# Altium footprint library MyPcbLib.PcbLib: 657 footprints (part 3 of 42)
Each footprint in its own frame and in the unit in brackets; x right, y up, seen from the top. Pads: shape width x height; smd on the part's side, far side on the other; paste and mask are expansions set on the pad; w line width, h text height; cw(c..) or ccw(c..) is an arc to the next point about the centre after c.
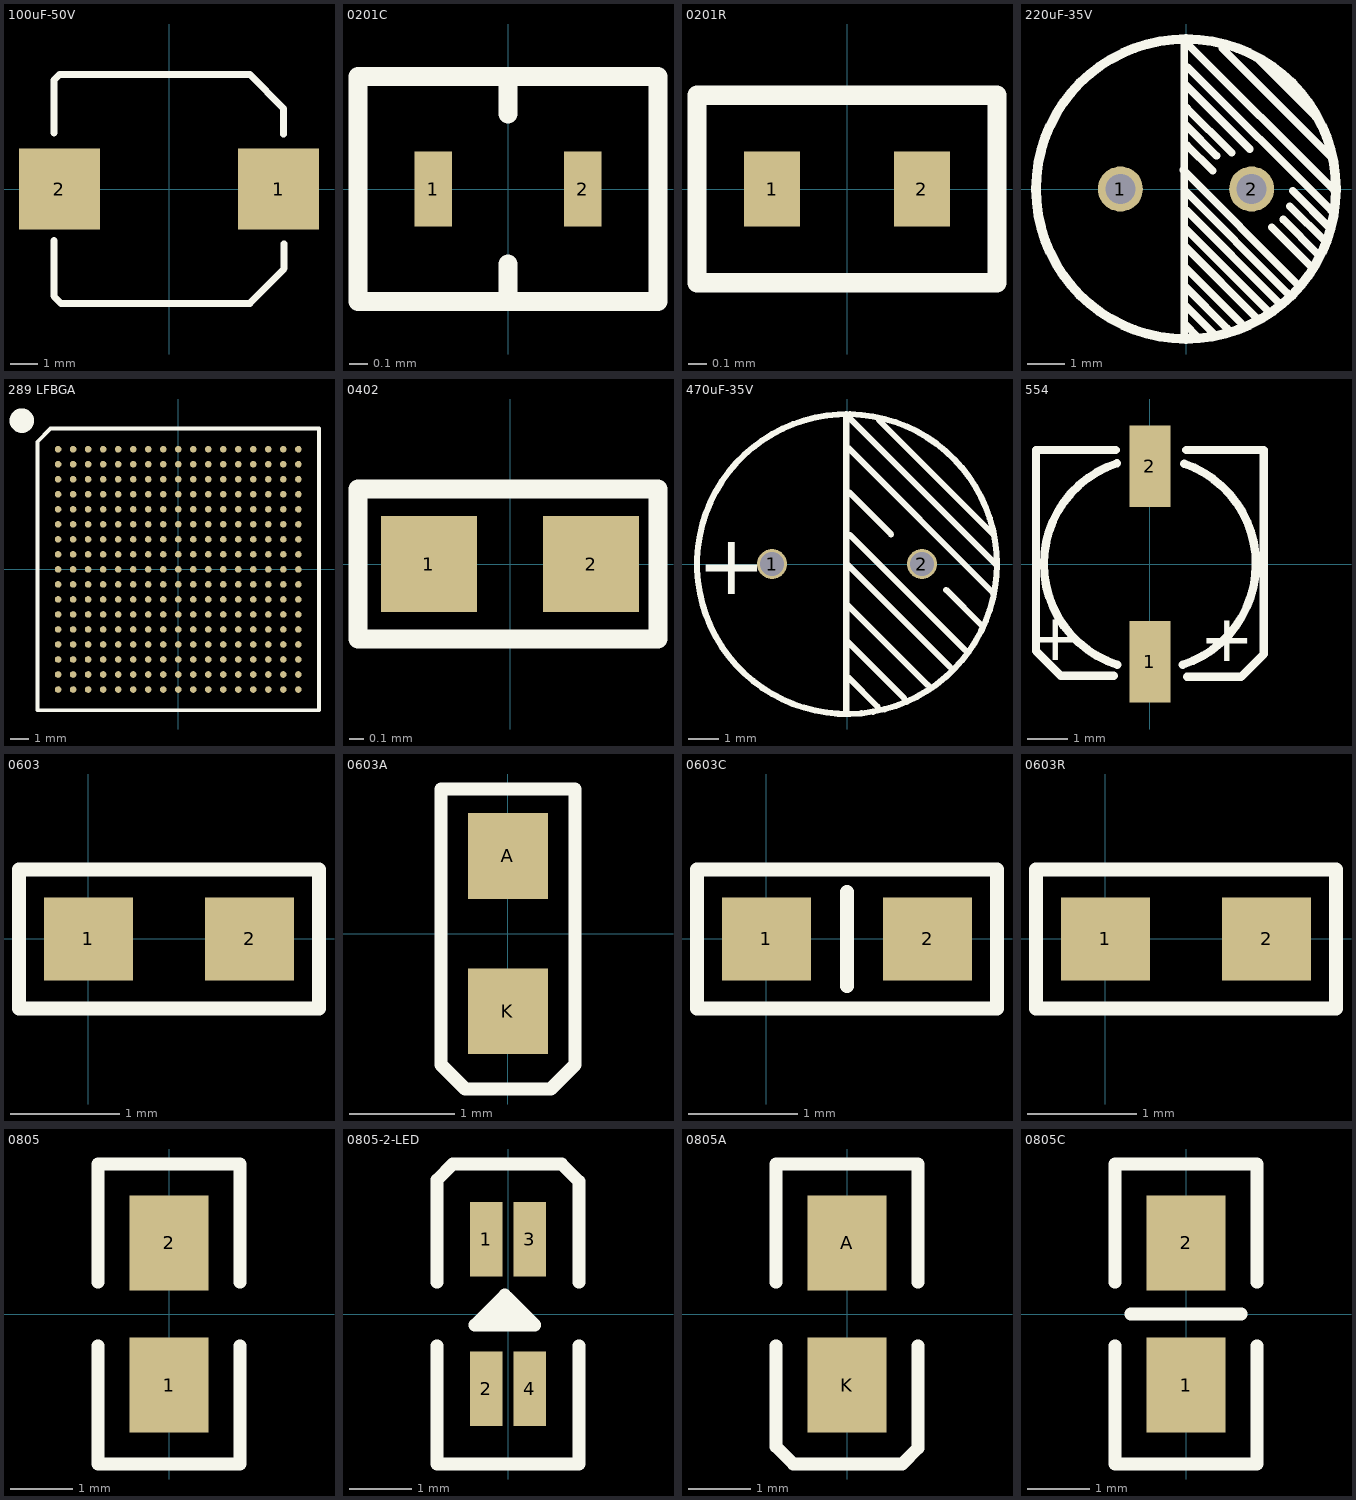
[diagram p2: the footprints below, top view; thin cyan lines are the x and y axes]

## 100uF-50V [mm]
pads (2):
  rect 3x3 smd: 1(4.064,0) 2(-4.064,0)
Top Overlay:
  lines w0.254: -4.267,-3.962 -4.267,-1.905 ; -4.267,2.083 -4.267,4.039 ; -4.25,-4.005 -4.005,-4.25 3,-4.25 ; -4.25,4.056 -4.056,4.25 3,4.25 ; 2.997,4.242 4.25,2.989 ; 3.01,-4.229 4.25,-2.989 ; 4.242,2.032 4.242,2.946 ; 4.267,-2.946 4.267,-2.032

## 0201C [mm]
pads (2):
  rect 0.2x0.4 smd: 1(-0.4,0) 2(0.4,0)
Top Overlay:
  lines w0.102: 0,-0.6 0,-0.4 ; 0,0.4 0,0.6 ; -0.8,-0.6 -0.8,0.6 0.8,0.6 0.8,-0.6 -0.8,-0.6

## 0201R [mm]
pads (2):
  rect 0.3x0.4 smd: 1(-0.4,0) 2(0.4,0)
Top Overlay:
  lines w0.102: -0.8,-0.5 -0.8,0.5 0.8,0.5 0.8,-0.5 -0.8,-0.5

## 220uF-35V [mm]
pads (2):
  round 1.2 hole 0.8: 1(-1.75,0) 2(1.75,0)
Top Overlay:
  circle w0.254: c0,0 r4
  lines w0.203: -0.076,0.508 2.972,-2.54 ; -0.051,-3.988 -0.051,3.962 ; -0.051,-3.581 0.33,-3.962 ; -0.051,-3.073 0.711,-3.835 ; -0.051,-2.057 1.473,-3.581 ; -0.051,-0.025 2.692,-2.769 ; -0.025,-1.041 2.21,-3.277 ; 0,-2.616 1.092,-3.708 ; 0,-1.549 1.905,-3.454 ; 0,-0.559 2.464,-3.023 ; 0,1.702 0.813,0.889 ; 0,2.769 1.702,1.067 ; 0.025,1.168 0.711,0.483 ; 0.025,2.159 1.219,0.965 ; 0.025,3.886 3.937,-0.025 ; 0.051,3.251 3.861,-0.559 ; 0.965,3.759 3.886,0.838 ; 1.956,3.429 3.454,1.93 ; 2.286,-1.016 3.378,-2.108 ; 2.591,-0.813 3.531,-1.753 ; 2.769,-0.457 3.734,-1.422 ; 2.845,-0.051 3.861,-1.067

## 289 LFBGA [mm]
pads (289):
  round 0.35 smd: A1(-6.4,6.4) A2(-5.6,6.4) A3(-4.8,6.4) A4(-4,6.4) A5(-3.2,6.4) A6(-2.4,6.4) A7(-1.6,6.4) A8(-0.8,6.4) A9(0,6.4) A10(0.8,6.4) A11(1.6,6.4) A12(2.4,6.4) A13(3.2,6.4) A14(4,6.4) A15(4.8,6.4) A16(5.6,6.4) A17(6.4,6.4) B1(-6.4,5.6) B2(-5.6,5.6) B3(-4.8,5.6) B4(-4,5.6) B5(-3.2,5.6) B6(-2.4,5.6) B7(-1.6,5.6) B8(-0.8,5.6) B9(0,5.6) B10(0.8,5.6) B11(1.6,5.6) B12(2.4,5.6) B13(3.2,5.6) B14(4,5.6) B15(4.8,5.6) B16(5.6,5.6) B17(6.4,5.6) C1(-6.4,4.8) C2(-5.6,4.8) C3(-4.8,4.8) C4(-4,4.8) C5(-3.2,4.8) C6(-2.4,4.8) C7(-1.6,4.8) C8(-0.8,4.8) C9(0,4.8) C10(0.8,4.8) C11(1.6,4.8) C12(2.4,4.8) C13(3.2,4.8) C14(4,4.8) C15(4.8,4.8) C16(5.6,4.8) C17(6.4,4.8) D1(-6.4,4) D2(-5.6,4) D3(-4.8,4) D4(-4,4) D5(-3.2,4) D6(-2.4,4) D7(-1.6,4) D8(-0.8,4) D9(0,4) D10(0.8,4) D11(1.6,4) D12(2.4,4) D13(3.2,4) D14(4,4) D15(4.8,4) D16(5.6,4) D17(6.4,4) E1(-6.4,3.2) E2(-5.6,3.2) E3(-4.8,3.2) E4(-4,3.2) E5(-3.2,3.2) E6(-2.4,3.2) E7(-1.6,3.2) E8(-0.8,3.2) E9(0,3.2) E10(0.8,3.2) E11(1.6,3.2) E12(2.4,3.2) E13(3.2,3.2) E14(4,3.2) E15(4.8,3.2) E16(5.6,3.2) E17(6.4,3.2) F1(-6.4,2.4) F2(-5.6,2.4) F3(-4.8,2.4) F4(-4,2.4) F5(-3.2,2.4) F6(-2.4,2.4) F7(-1.6,2.4) F8(-0.8,2.4) F9(0,2.4) F10(0.8,2.4) F11(1.6,2.4) F12(2.4,2.4) F13(3.2,2.4) F14(4,2.4) F15(4.8,2.4) F16(5.6,2.4) F17(6.4,2.4) G1(-6.4,1.6) G2(-5.6,1.6) G3(-4.8,1.6) G4(-4,1.6) G5(-3.2,1.6) G6(-2.4,1.6) G7(-1.6,1.6) G8(-0.8,1.6) G9(0,1.6) G10(0.8,1.6) G11(1.6,1.6) G12(2.4,1.6) G13(3.2,1.6) G14(4,1.6) G15(4.8,1.6) G16(5.6,1.6) G17(6.4,1.6) H1(-6.4,0.8) H2(-5.6,0.8) H3(-4.8,0.8) H4(-4,0.8) H5(-3.2,0.8) H6(-2.4,0.8) H7(-1.6,0.8) H8(-0.8,0.8) H9(0,0.8) H10(0.8,0.8) H11(1.6,0.8) H12(2.4,0.8) H13(3.2,0.8) H14(4,0.8) H15(4.8,0.8) H16(5.6,0.8) H17(6.4,0.8) J1(-6.4,0) J2(-5.6,0) J3(-4.8,0) J4(-4,0) J5(-3.2,0) J6(-2.4,0) J7(-1.6,0) J8(-0.8,0) J9(0,0) J10(0.8,0) J11(1.6,0) J12(2.4,0) J13(3.2,0) J14(4,0) J15(4.8,0) J16(5.6,0) J17(6.4,0) K1(-6.4,-0.8) K2(-5.6,-0.8) K3(-4.8,-0.8) K4(-4,-0.8) K5(-3.2,-0.8) K6(-2.4,-0.8) K7(-1.6,-0.8) K8(-0.8,-0.8) K9(0,-0.8) K10(0.8,-0.8) K11(1.6,-0.8) K12(2.4,-0.8) K13(3.2,-0.8) K14(4,-0.8) K15(4.8,-0.8) K16(5.6,-0.8) K17(6.4,-0.8) L1(-6.4,-1.6) L2(-5.6,-1.6) L3(-4.8,-1.6) L4(-4,-1.6) L5(-3.2,-1.6) L6(-2.4,-1.6) L7(-1.6,-1.6) L8(-0.8,-1.6) L9(0,-1.6) L10(0.8,-1.6) L11(1.6,-1.6) L12(2.4,-1.6) L13(3.2,-1.6) L14(4,-1.6) L15(4.8,-1.6) L16(5.6,-1.6) L17(6.4,-1.6) M1(-6.4,-2.4) M2(-5.6,-2.4) M3(-4.8,-2.4) M4(-4,-2.4) M5(-3.2,-2.4) M6(-2.4,-2.4) M7(-1.6,-2.4) M8(-0.8,-2.4) M9(0,-2.4) M10(0.8,-2.4) M11(1.6,-2.4) M12(2.4,-2.4) M13(3.2,-2.4) M14(4,-2.4) M15(4.8,-2.4) M16(5.6,-2.4) M17(6.4,-2.4) N1(-6.4,-3.2) N2(-5.6,-3.2) N3(-4.8,-3.2) N4(-4,-3.2) N5(-3.2,-3.2) N6(-2.4,-3.2) N7(-1.6,-3.2) N8(-0.8,-3.2) N9(0,-3.2) N10(0.8,-3.2) N11(1.6,-3.2) N12(2.4,-3.2) N13(3.2,-3.2) N14(4,-3.2) N15(4.8,-3.2) N16(5.6,-3.2) N17(6.4,-3.2) P1(-6.4,-4) P2(-5.6,-4) P3(-4.8,-4) P4(-4,-4) P5(-3.2,-4) P6(-2.4,-4) P7(-1.6,-4) P8(-0.8,-4) P9(0,-4) P10(0.8,-4) P11(1.6,-4) P12(2.4,-4) P13(3.2,-4) P14(4,-4) P15(4.8,-4) P16(5.6,-4) P17(6.4,-4) R1(-6.4,-4.8) R2(-5.6,-4.8) R3(-4.8,-4.8) R4(-4,-4.8) R5(-3.2,-4.8) R6(-2.4,-4.8) R7(-1.6,-4.8) R8(-0.8,-4.8) R9(0,-4.8) R10(0.8,-4.8) R11(1.6,-4.8) R12(2.4,-4.8) R13(3.2,-4.8) R14(4,-4.8) R15(4.8,-4.8) R16(5.6,-4.8) R17(6.4,-4.8) T1(-6.4,-5.6) T2(-5.6,-5.6) T3(-4.8,-5.6) T4(-4,-5.6) T5(-3.2,-5.6) T6(-2.4,-5.6) T7(-1.6,-5.6) T8(-0.8,-5.6) T9(0,-5.6) T10(0.8,-5.6) T11(1.6,-5.6) T12(2.4,-5.6) T13(3.2,-5.6) T14(4,-5.6) T15(4.8,-5.6) T16(5.6,-5.6) T17(6.4,-5.6) U1(-6.4,-6.4) U2(-5.6,-6.4) U3(-4.8,-6.4) U4(-4,-6.4) U5(-3.2,-6.4) U6(-2.4,-6.4) U7(-1.6,-6.4) U8(-0.8,-6.4) U9(0,-6.4) U10(0.8,-6.4) U11(1.6,-6.4) U12(2.4,-6.4) U13(3.2,-6.4) U14(4,-6.4) U15(4.8,-6.4) U16(5.6,-6.4) U17(6.4,-6.4)
Top Overlay:
  circle w1: c-8.332,7.924 r0.15
  lines w0.2: -7.5,-7.5 -7.5,6.8 -6.8,7.5 7.5,7.5 7.5,-7.5 -7.5,-7.5

## 0402 [mm]
pads (2):
  rect 0.65x0.65 smd mask+0.05: 1(-0.55,0) 2(0.55,0)
Top Overlay:
  lines w0.127: -1.03,-0.508 1.002,-0.508 1.002,0.508 -1.03,0.508 -1.03,-0.508

## 470uF-35V [mm]
pads (2):
  round 1 hole 0.8: 1(-2.5,0) 2(2.5,0)
Top Overlay:
  circle w0.203: c0,0 r5
  lines w0.203: -0.025,-4.928 -0.025,5.004 ; -0.025,-1.321 2.692,-4.039 ; -0.025,0.025 3.429,-3.429 ; 0.025,-2.591 1.905,-4.47 ; 0.051,-3.785 1.016,-4.75 ; 0.051,3.861 4.851,-0.94 ; 0.051,4.902 4.928,0.025 ; 0.076,2.388 1.473,0.991 ; 0.102,0.965 3.937,-2.87 ; 1.067,4.801 4.851,1.016 ; 3.302,-0.864 4.521,-2.083
  text "+" at -5,-1 h2

## 554 [mm] "16V"
pads (2):
  rect 1x2 smd: 1(0,-2.4) 2(0,2.4)
Top Overlay:
  lines w0.203: -0.889,-2.743 -2.184,-2.743 -2.794,-2.134 -2.794,2.794 -0.838,2.794 ; -0.807,2.472 ccw(c0,0) -0.8,-2.474 ; 0.807,-2.472 ccw(c0,0) 0.845,2.459 ; 0.889,2.794 2.794,2.794 2.794,-2.21 2.235,-2.769 0.911,-2.769
  text "+" at 2.565,-2.769 h2
  text "+" at -1.651,-2.743 h2

## 0603 [mil]
pads (2):
  rect 32x30 smd: 1(0,0) 2(58,0)
Top Overlay:
  lines w5: -25,-25 83,-25 83,25 -25,25 -25,-25
3D body: height 22.05, standoff 0, extent -2.46,-15.74 64.47,15.75

## 0603A [mil]
pads (2):
  rect 30x32 smd: A(0,29) K(0,-29)
Top Overlay:
  lines w5: -25,-49 -25,54 25,54 25,-49 16,-58 -16,-58 -25,-49
3D body: height 22.05, standoff 0, extent -15.75,-31.46 15.74,35.47

## 0603C [mil]
pads (2):
  rect 32x30 smd: 1(0,0) 2(58,0)
Top Overlay:
  lines w5: 29,-17 29,17 ; -25,-25 83,-25 83,25 -25,25 -25,-25
3D body: height 11.89, standoff 0, extent -1.49,-14.74 61.5,16.75

## 0603R [mil]
pads (2):
  rect 32x30 smd: 1(0,0) 2(58,0)
Top Overlay:
  lines w5: -25,-25 83,-25 83,25 -25,25 -25,-25
3D body: height 22.05, standoff 0, extent -2.46,-15.74 64.47,15.75

## 0805 [mil]
pads (2):
  rect 50x60 smd: 1(0,-45) 2(0,45)
Top Overlay:
  lines w8: -45,-20 -45,-95 45,-95 45,-20 ; -45,20 -45,95 45,95 45,20
3D body: height 35.43, standoff 0, extent -25.6,-36.37 23.61,42.37

## 0805-2-LED [mm]
pads (4):
  rect 0.52x1.2 smd: 1(-0.35,1.2) 2(-0.35,-1.2) 3(0.35,1.2) 4(0.35,-1.2)
Top Overlay:
  lines w0.203: -1.143,-0.508 -1.143,-2.413 1.143,-2.413 1.143,-0.508 ; -1.143,0.508 -1.143,2.159 -0.889,2.413 0.864,2.413 1.143,2.134 1.143,0.508 ; -0.305,-0.051 0.127,-0.051 0.178,0 ; -0.178,0.076 0,-0.102 0.203,-0.102 ; -0.051,-0.102 -0.025,-0.076 -0.025,0.279 0.432,-0.178 -0.533,-0.178 -0.051,0.305
3D body: height 1.1, standoff 0, extent -0.65,-0.934 0.6,1.086

## 0805A [mil]
pads (2):
  rect 50x60 smd: A(0,45) K(0,-45)
Top Overlay:
  lines w8: -45,-20 -45,-84 -34,-95 35,-95 45,-85 45,-20 ; -45,20 -45,95 45,95 45,20
3D body: height 43.31, standoff 0, extent -23.61,-42.76 25.6,36.76

## 0805C [mil]
pads (2):
  rect 50x60 smd: 1(0,-45) 2(0,45)
Top Overlay:
  lines w8: -45,-20 -45,-95 45,-95 45,-20 ; -45,20 -45,95 45,95 45,20 ; -35,0 35,0
3D body: height 35.43, standoff 0, extent -25.6,-36.37 23.61,42.37